# Altium footprint library PcbLib_ICs.PcbLib: 317 footprints (part 18 of 24)
Each footprint in its own frame and in the unit in brackets; x right, y up, seen from the top. Pads: shape width x height; smd on the part's side, far side on the other; paste and mask are expansions set on the pad; w line width, h text height; cw(c..) or ccw(c..) is an arc to the next point about the centre after c.
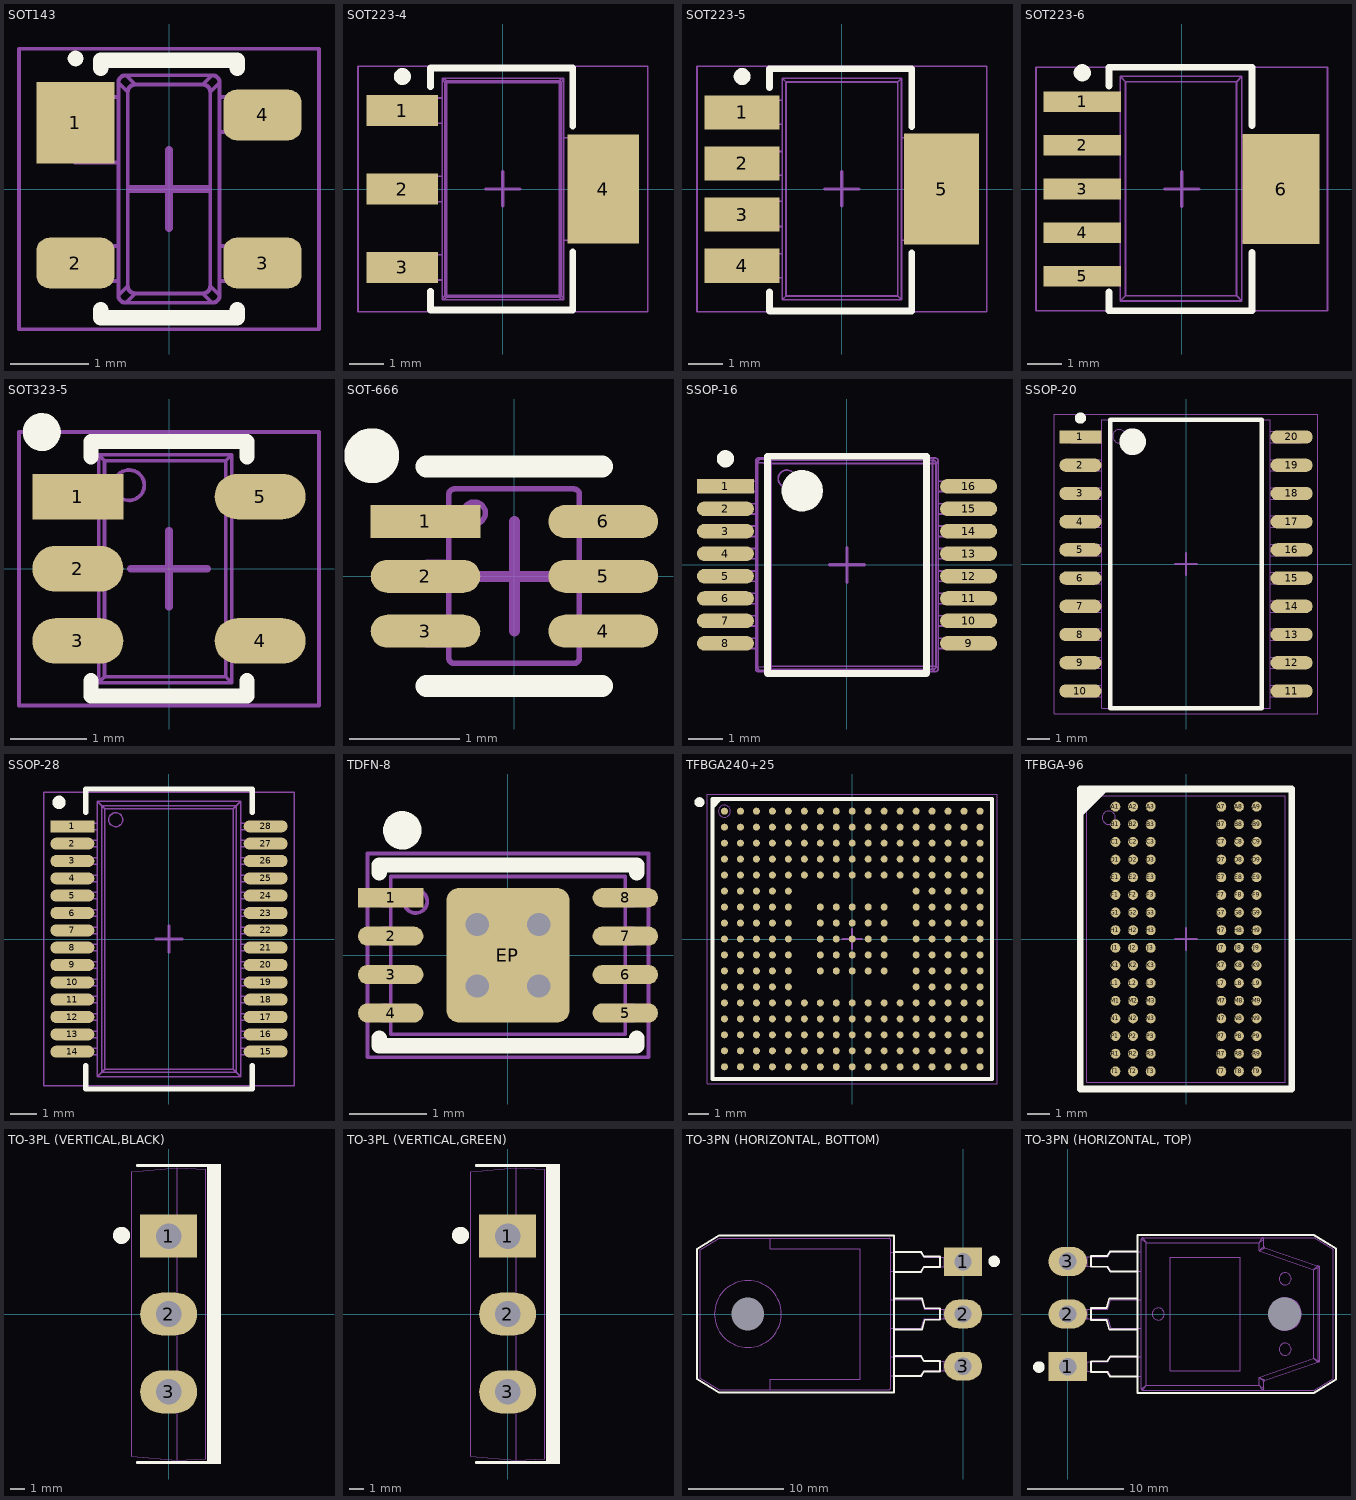
[diagram p17: the footprints below, top view; thin cyan lines are the x and y axes]

## SOT143 [mm] "SOT143, 4-Leads, Body 2.92x2.37mm, Pitch 1.90mm, IPC Medium Density"
height 1.2
pads (4):
  rect 1x1.05 smd paste+0 mask+0.05: 1(-1.2,0.85)
  rrect50% 1x0.65 smd paste+0 mask+0.05: 2(-1.2,-0.95) 3(1.2,-0.95) 4(1.2,0.95)
Top Overlay:
  circle w0.1: c-1.2,1.675 r0.05
  lines w0.2: -0.875,-1.55 -0.875,-1.65 0.875,-1.65 0.875,-1.55 ; -0.875,1.55 -0.875,1.65 0.875,1.65 0.875,1.55
Top Assy:
  drawing of 864 lines, arcs and shapes, not listed
  text ".Designator" at 0.233,-1.719 h1
Top Text:
  lines w0.05: -1.925,-1.8 1.925,-1.8 1.925,1.8 -1.925,1.8 -1.925,-1.8
  lines w0.1: -0.5,0 0.5,0 ; 0,-0.5 0,0.5
3D body "User Library-SOT143-1.step": height 1.22, standoff 0, extent -1.181,-1.45 1.182,1.45

## SOT223-4 [mm] "SOT223, 4-Leads, Body 6.50x7.00mm (avg), Pitch 2.30mm, IPC Medium Density"
height 1.8
pads (4):
  rect 2.1x0.9 smd paste+0 mask+0.05: 1(-2.95,2.3) 2(-2.95,0) 3(-2.95,-2.3)
  rect 2.1x3.2 smd paste-50 mask+0.05: 4(2.95,0)
Top Overlay:
  circle w0.25: c-2.95,3.3 r0.125
  lines w0.2: -2.125,-3 -2.125,-3.55 ; -2.125,3 -2.125,3.55 ; 2.05,-1.85 2.05,-3.55 -2.125,-3.55 ; 2.05,1.85 2.05,3.55 -2.125,3.55 ; -2.125,-3.55 -2.125,-3.55 ; -2.125,3.55 -2.125,3.55
Top Paste:
  region: 3.2,1.15 3.2,1.65 2.7,1.65 2.7,1.15
  region: 3.2,-0.25 3.2,0.25 2.7,0.25 2.7,-0.25
  region: 2.7,0.95 2.7,0.45 3.2,0.45 3.2,0.95
  region: 3.2,-0.95 3.2,-0.45 2.7,-0.45 2.7,-0.95
  region: 3.9,1.15 3.9,1.65 3.4,1.65 3.4,1.15
  region: 3.9,-0.25 3.9,0.25 3.4,0.25 3.4,-0.25
  region: 3.4,0.95 3.4,0.45 3.9,0.45 3.9,0.95
  region: 3.9,-0.95 3.9,-0.45 3.4,-0.45 3.4,-0.95
  region: 2.5,1.15 2.5,1.65 2,1.65 2,1.15
  region: 2.5,-0.25 2.5,0.25 2,0.25 2,-0.25
  region: 2,0.95 2,0.45 2.5,0.45 2.5,0.95
  region: 2.5,-0.95 2.5,-0.45 2,-0.45 2,-0.95
  region: 3.2,-1.65 3.2,-1.15 2.7,-1.15 2.7,-1.65
  region: 3.9,-1.65 3.9,-1.15 3.4,-1.15 3.4,-1.65
  region: 2.5,-1.65 2.5,-1.15 2,-1.15 2,-1.65
Top Assy:
  drawing of 521 lines, arcs and shapes, not listed
  text ".Designator" at 0.467,-3.443 h2
Top Text:
  lines w0.05: -4.25,-3.6 -4.25,3.6 4.25,3.6 4.25,-3.6 -4.25,-3.6
  lines w0.1: -0.5,0 0.5,0 ; 0,-0.5 0,0.5
3D body "SOT230P700X180-4N.step": height 1.8, standoff 0, extent -3.5,-3.35 3.5,3.35

## SOT223-5 [mm] "SOT223, 5-Leads, Body 6.50x7.00mm (avg), Pitch 1.50mm, IPC Medium Density"
height 1.8
pads (5):
  rect 2.2x1 smd paste+0 mask+0.05: 1(-2.925,2.25) 2(-2.925,0.75) 3(-2.925,-0.75) 4(-2.925,-2.25)
  rect 2.2x3.25 smd paste-50 mask+0.05: 5(2.925,0)
Top Overlay:
  circle w0.25: c-2.925,3.3 r0.125
  lines w0.2: -2.125,-3.025 -2.125,-3.575 2.05,-3.575 2.05,-1.875 ; -2.125,2.975 -2.125,3.525 2.05,3.525 2.05,1.825
Top Paste:
  region: 3.175,1.15 3.175,1.65 2.675,1.65 2.675,1.15
  region: 3.175,-0.25 3.175,0.25 2.675,0.25 2.675,-0.25
  region: 2.675,0.95 2.675,0.45 3.175,0.45 3.175,0.95
  region: 3.175,-0.95 3.175,-0.45 2.675,-0.45 2.675,-0.95
  region: 3.875,1.15 3.875,1.65 3.375,1.65 3.375,1.15
  region: 3.875,-0.25 3.875,0.25 3.375,0.25 3.375,-0.25
  region: 3.375,0.95 3.375,0.45 3.875,0.45 3.875,0.95
  region: 3.875,-0.95 3.875,-0.45 3.375,-0.45 3.375,-0.95
  region: 2.475,1.15 2.475,1.65 1.975,1.65 1.975,1.15
  region: 2.475,-0.25 2.475,0.25 1.975,0.25 1.975,-0.25
  region: 1.975,0.95 1.975,0.45 2.475,0.45 2.475,0.95
  region: 2.475,-0.95 2.475,-0.45 1.975,-0.45 1.975,-0.95
  region: 3.175,-1.65 3.175,-1.15 2.675,-1.15 2.675,-1.65
  region: 3.875,-1.65 3.875,-1.15 3.375,-1.15 3.375,-1.65
  region: 2.475,-1.65 2.475,-1.15 1.975,-1.15 1.975,-1.65
Top Assy:
  lines w0.05: -2.772,-2.6 -2.772,-1.9 ; -2.772,-2.6 -3.5,-2.6 -3.5,-1.9 -2.772,-1.9 ; -2.772,-2.6 -2.587,-2.6 ; -2.772,-1.9 -2.587,-1.9 ; -2.772,-1.1 -2.772,-0.361 ; -2.772,-1.1 -3.5,-1.1 -3.5,-0.361 -2.772,-0.361 ; -2.772,-1.1 -2.587,-1.1 ; -2.772,-0.361 -2.587,-0.361 ; -2.772,0.4 -2.772,1.1 ; -2.772,0.4 -3.5,0.4 -3.5,1.1 -2.772,1.1 ; -2.772,0.4 -2.587,0.4 ; -2.772,1.1 -2.587,1.1 ; -2.772,1.9 -2.772,2.6 ; -2.772,1.9 -3.5,1.9 -3.5,2.6 -2.772,2.6 ; -2.772,1.9 -2.587,1.9 ; -2.772,2.6 -2.587,2.6 ; -2.587,-2.6 -2.587,-1.9 ; -2.587,-2.6 -2.349,-2.6 ; -2.587,-1.9 -2.349,-1.9 ; -2.587,-1.1 -2.587,-0.361 ; -2.587,-1.1 -2.349,-1.1 ; -2.587,-0.361 -2.349,-0.361 ; -2.587,0.4 -2.587,1.1 ; -2.587,0.4 -2.349,0.4 ; -2.587,1.1 -2.349,1.1 ; -2.587,1.9 -2.587,2.6 ; -2.587,1.9 -2.349,1.9 ; -2.587,2.6 -2.349,2.6 ; -2.349,-2.6 -2.349,-1.9 ; -2.349,-2.6 -1.978,-2.6 ; -2.349,-1.9 -1.978,-1.9 ; -2.349,-1.1 -2.349,-0.361 ; -2.349,-1.1 -1.978,-1.1 ; -2.349,-0.361 -1.978,-0.361 ; -2.349,0.4 -2.349,1.1 ; -2.349,0.4 -1.978,0.4 ; -2.349,1.1 -1.978,1.1 ; -2.349,1.9 -2.349,2.6 ; -2.349,1.9 -1.978,1.9 ; -2.349,2.6 -1.978,2.6 ; -1.978,-2.6 -1.978,-1.9 ; -1.978,-2.6 -1.75,-2.6 ; -1.978,-1.9 -1.75,-1.9 ; -1.978,-1.1 -1.978,-0.361 ; -1.978,-1.1 -1.75,-1.1 ; -1.978,-0.361 -1.75,-0.361 ; -1.978,0.4 -1.978,1.1 ; -1.978,0.4 -1.75,0.4 ; -1.978,1.1 -1.75,1.1 ; -1.978,1.9 -1.978,2.6 ; -1.978,1.9 -1.75,1.9 ; -1.978,2.6 -1.75,2.6 ; -1.75,-3.25 1.75,-3.25 ; -1.75,-3.25 -1.641,-3.141 ; -1.75,-3.25 -1.75,-2.6 ; -1.75,-2.6 -1.75,-1.9 ; -1.75,-1.9 -1.75,-1.1 ; -1.75,-1.1 -1.75,-0.361 ; -1.75,-0.361 -1.75,0.4 ; -1.75,0.4 -1.75,1.1 ; -1.75,1.1 -1.75,1.9 ; -1.75,1.9 -1.75,2.6 ; -1.75,2.6 -1.75,3.25 ; -1.75,3.25 1.75,3.25 ; -1.75,3.25 -1.641,3.141 ; -1.641,-3.141 1.641,-3.141 ; -1.641,-3.141 -1.641,3.141 ; -1.641,3.141 1.641,3.141 ; 1.641,-3.141 1.641,3.141 ; 1.641,-3.141 1.75,-3.25 ; 1.641,3.141 1.75,3.25 ; 1.75,-3.25 1.75,-1.5 ; 1.75,-1.5 1.978,-1.5 ; 1.75,-1.5 1.75,1.5 ; 1.75,1.5 1.978,1.5 ; 1.75,1.5 1.75,3.25 ; 1.978,-1.5 1.978,1.5 ; 1.978,-1.5 2.349,-1.5 ; 1.978,1.5 2.349,1.5 ; 2.349,-1.5 2.349,1.5 ; 2.349,-1.5 2.587,-1.5 ; 2.349,1.5 2.587,1.5 ; 2.587,-1.5 2.587,1.5 ; 2.587,-1.5 2.772,-1.5 ; 2.587,1.5 2.772,1.5 ; 2.772,-1.5 2.772,1.5 ; 2.772,-1.5 3.5,-1.5 3.5,1.5 2.772,1.5
  text ".Designator" at 0.467,-3.443 h2
Top Text:
  lines w0.05: -4.25,-3.6 4.25,-3.6 4.25,3.6 -4.25,3.6 -4.25,-3.6
  lines w0.1: -0.5,0 0.5,0 ; 0,-0.5 0,0.5
3D body "SOT150P700X180-5N.step": height 1.8, standoff 0, extent -3.5,-3.35 3.5,3.35

## SOT223-6 [mm] "SOT223, 6-Leads, Body 6.50x7.00mm (avg), Pitch 1.27mm, IPC Medium Density"
height 1.8
pads (6):
  rect 2.25x0.6 smd paste+0 mask+0.05: 1(-2.9,2.54) 2(-2.9,1.27) 3(-2.9,0) 4(-2.9,-1.27) 5(-2.9,-2.54)
  rect 2.25x3.2 smd paste-50 mask+0.05: 6(2.9,0)
Top Overlay:
  circle w0.25: c-2.9,3.39 r0.125
  lines w0.2: -2.125,-3 -2.125,-3.55 2.05,-3.55 2.05,-1.85 ; -2.125,3 -2.125,3.55 2.05,3.55 2.05,1.85
Top Paste:
  region: 2.45,-1.65 2.45,-1.15 1.95,-1.15 1.95,-1.65
  region: 3.85,-1.65 3.85,-1.15 3.35,-1.15 3.35,-1.65
  region: 3.15,-1.65 3.15,-1.15 2.65,-1.15 2.65,-1.65
  region: 2.45,-0.95 2.45,-0.45 1.95,-0.45 1.95,-0.95
  region: 1.95,0.95 1.95,0.45 2.45,0.45 2.45,0.95
  region: 2.45,-0.25 2.45,0.25 1.95,0.25 1.95,-0.25
  region: 2.45,1.15 2.45,1.65 1.95,1.65 1.95,1.15
  region: 3.85,-0.95 3.85,-0.45 3.35,-0.45 3.35,-0.95
  region: 3.35,0.95 3.35,0.45 3.85,0.45 3.85,0.95
  region: 3.85,-0.25 3.85,0.25 3.35,0.25 3.35,-0.25
  region: 3.85,1.15 3.85,1.65 3.35,1.65 3.35,1.15
  region: 3.15,-0.95 3.15,-0.45 2.65,-0.45 2.65,-0.95
  region: 2.65,0.95 2.65,0.45 3.15,0.45 3.15,0.95
  region: 3.15,-0.25 3.15,0.25 2.65,0.25 2.65,-0.25
  region: 3.15,1.15 3.15,1.65 2.65,1.65 2.65,1.15
Top Assy:
  lines w0.05: -3.078,-2.78 -3.078,-2.28 ; -3.078,-2.78 -3.65,-2.78 -3.65,-2.28 -3.078,-2.28 ; -3.078,-2.78 -2.794,-2.78 ; -3.078,-2.28 -2.794,-2.28 ; -3.078,-1.51 -3.078,-1.01 ; -3.078,-1.51 -3.65,-1.51 -3.65,-1.01 -3.078,-1.01 ; -3.078,-1.51 -2.794,-1.51 ; -3.078,-1.01 -2.794,-1.01 ; -3.078,-0.24 -3.65,-0.24 -3.65,0.26 -3.078,0.26 ; -3.078,-0.24 -2.794,-0.24 ; -3.078,-0.24 -3.078,0.26 ; -3.078,0.26 -2.794,0.26 ; -3.078,1.03 -3.078,1.53 ; -3.078,1.03 -3.65,1.03 -3.65,1.53 -3.078,1.53 ; -3.078,1.03 -2.794,1.03 ; -3.078,1.53 -2.794,1.53 ; -3.078,2.3 -3.078,2.8 ; -3.078,2.3 -3.65,2.3 -3.65,2.8 -3.078,2.8 ; -3.078,2.3 -2.794,2.3 ; -3.078,2.8 -2.794,2.8 ; -2.794,-2.78 -2.794,-2.28 ; -2.794,-2.78 -2.719,-2.78 ; -2.794,-2.28 -2.719,-2.28 ; -2.794,-1.51 -2.794,-1.01 ; -2.794,-1.51 -2.719,-1.51 ; -2.794,-1.01 -2.719,-1.01 ; -2.794,-0.24 -2.719,-0.24 ; -2.794,-0.24 -2.794,0.26 ; -2.794,0.26 -2.719,0.26 ; -2.794,1.03 -2.794,1.53 ; -2.794,1.03 -2.719,1.03 ; -2.794,1.53 -2.719,1.53 ; -2.794,2.3 -2.794,2.8 ; -2.794,2.3 -2.719,2.3 ; -2.794,2.8 -2.719,2.8 ; -2.719,-2.78 -2.719,-2.28 ; -2.719,-2.78 -2.224,-2.78 ; -2.719,-2.28 -2.224,-2.28 ; -2.719,-1.51 -2.719,-1.01 ; -2.719,-1.51 -2.224,-1.51 ; -2.719,-1.01 -2.224,-1.01 ; -2.719,-0.24 -2.224,-0.24 ; -2.719,-0.24 -2.719,0.26 ; -2.719,0.26 -2.224,0.26 ; -2.719,1.03 -2.719,1.53 ; -2.719,1.03 -2.224,1.03 ; -2.719,1.53 -2.224,1.53 ; -2.719,2.3 -2.719,2.8 ; -2.719,2.3 -2.224,2.3 ; -2.719,2.8 -2.224,2.8 ; -2.224,-2.78 -2.224,-2.28 ; -2.224,-2.78 -1.795,-2.78 ; -2.224,-2.28 -1.795,-2.28 ; -2.224,-1.51 -2.224,-1.01 ; -2.224,-1.51 -1.795,-1.51 ; -2.224,-1.01 -1.795,-1.01 ; -2.224,-0.24 -2.224,0.26 ; -2.224,-0.24 -1.795,-0.24 ; -2.224,0.26 -1.795,0.26 ; -2.224,1.03 -2.224,1.53 ; -2.224,1.03 -1.795,1.03 ; -2.224,1.53 -1.795,1.53 ; -2.224,2.3 -2.224,2.8 ; -2.224,2.3 -1.795,2.3 ; -2.224,2.8 -1.795,2.8 ; -1.795,-3.265 -1.795,-2.78 ; -1.795,-3.265 -1.64,-3.11 ; -1.795,-3.265 1.755,-3.265 ; -1.795,-2.78 -1.795,-2.28 ; -1.795,-2.28 -1.795,-1.51 ; -1.795,-1.51 -1.795,-1.01 ; -1.795,-1.01 -1.795,-0.24 ; -1.795,-0.24 -1.795,0.26 ; -1.795,0.26 -1.795,1.03 ; -1.795,1.03 -1.795,1.53 ; -1.795,1.53 -1.795,2.3 ; -1.795,2.3 -1.795,2.8 ; -1.795,2.8 -1.795,3.285 ; -1.795,3.285 -1.64,3.13 ; -1.795,3.285 1.755,3.285 ; -1.64,-3.11 -1.64,3.13 ; -1.64,-3.11 1.6,-3.11 ; -1.64,3.13 1.6,3.13 ; 1.6,-3.11 1.755,-3.265 ; 1.6,-3.11 1.6,3.13 ; 1.6,3.13 1.755,3.285 ; 1.755,-3.265 1.755,-1.515 ; 1.755,-1.515 1.755,1.535 ; 1.755,-1.515 2.184,-1.515 ; 1.755,1.535 1.755,3.285 ; 1.755,1.535 2.184,1.535 ; 2.184,-1.515 2.679,-1.515 ; 2.184,-1.515 2.184,1.535 ; 2.184,1.535 2.679,1.535 ; 2.679,-1.515 2.754,-1.515 ; 2.679,-1.515 2.679,1.535 ; 2.679,1.535 2.754,1.535 ; 2.754,-1.515 3.038,-1.515 ; 2.754,-1.515 2.754,1.535 ; 2.754,1.535 3.038,1.535 ; 3.038,-1.515 3.61,-1.515 3.61,1.535 3.038,1.535 ; 3.038,-1.515 3.038,1.535
  text ".Designator" at 0.467,-3.443 h2
Top Text:
  lines w0.05: -4.25,-3.55 4.25,-3.55 4.25,3.55 -4.25,3.55 -4.25,-3.55
  lines w0.1: -0.5,0 0.5,0 ; 0,-0.5 0,0.5
3D body "SOT-223-6.STEP": height 1.8, standoff 0, extent -3.63,-3.275 3.63,3.275

## SOT323-5 [mm] "SOT23, 5-Leads, Body 2.90x2.80mm, Pitch 0.95mm, IPC Medium Density"
height 1.1
pads (5):
  rect 1.2x0.6 smd paste+0 mask+0.05: 1(-1.2,0.95)
  oval 1.2x0.6 smd paste+0 mask+0.05: 2(-1.2,0) 3(-1.2,-0.95) 4(1.2,-0.95) 5(1.2,0.95)
Top Overlay:
  circle w0.25: c-1.675,1.8 r0.125
  lines w0.2: -1.025,-1.475 -1.025,-1.675 1.025,-1.675 1.025,-1.475 ; -1.025,1.475 -1.025,1.675 1.025,1.675 1.025,1.475
Top Assy:
  circle w0.05: c-0.525,1.1 r0.2
  lines w0.05: -1.35,-1.15 -1.35,-0.75 ; -1.35,-1.15 -1.55,-1.15 -1.55,-0.75 -1.35,-0.75 ; -1.35,-1.15 -1.311,-1.15 ; -1.35,-0.75 -1.311,-0.75 ; -1.35,-0.2 -1.35,0.2 ; -1.35,-0.2 -1.55,-0.2 -1.55,0.2 -1.35,0.2 ; -1.35,-0.2 -1.311,-0.2 ; -1.35,0.2 -1.311,0.2 ; -1.35,0.75 -1.35,1.15 ; -1.35,0.75 -1.55,0.75 -1.55,1.15 -1.35,1.15 ; -1.35,0.75 -1.311,0.75 ; -1.35,1.15 -1.311,1.15 ; -1.311,-1.15 -1.311,-0.75 ; -1.311,-1.15 -1.183,-1.15 ; -1.311,-0.75 -1.183,-0.75 ; -1.311,-0.2 -1.311,0.2 ; -1.311,-0.2 -1.183,-0.2 ; -1.311,0.2 -1.183,0.2 ; -1.311,0.75 -1.311,1.15 ; -1.311,0.75 -1.183,0.75 ; -1.311,1.15 -1.183,1.15 ; -1.183,-1.15 -1.183,-0.75 ; -1.183,-1.15 -1.025,-1.15 ; -1.183,-0.75 -1.025,-0.75 ; -1.183,-0.2 -1.183,0.2 ; -1.183,-0.2 -1.025,-0.2 ; -1.183,0.2 -1.025,0.2 ; -1.183,0.75 -1.183,1.15 ; -1.183,0.75 -1.025,0.75 ; -1.183,1.15 -1.025,1.15 ; -1.025,-1.15 -1.025,-0.75 ; -1.025,-1.15 -0.925,-1.15 -0.925,-0.75 -1.025,-0.75 ; -1.025,-0.2 -1.025,0.2 ; -1.025,-0.2 -0.925,-0.2 -0.925,0.2 -1.025,0.2 ; -1.025,0.75 -1.025,1.15 ; -1.025,0.75 -0.925,0.75 -0.925,1.15 -1.025,1.15 ; -0.925,-1.5 0.825,-1.5 ; -0.925,-1.5 -0.925,1.5 ; -0.925,-1.5 -0.847,-1.422 ; -0.925,1.5 0.825,1.5 ; -0.925,1.5 -0.847,1.422 ; -0.847,-1.422 0.747,-1.422 ; -0.847,-1.422 -0.847,1.422 ; -0.847,1.422 0.747,1.422 ; 0.747,-1.422 0.747,1.422 ; 0.747,-1.422 0.825,-1.5 ; 0.747,1.422 0.825,1.5 ; 0.825,-1.5 0.825,1.5 ; 0.925,-1.15 0.925,-0.75 ; 0.925,-1.15 1.083,-1.15 ; 0.925,-1.15 0.825,-1.15 0.825,-0.75 0.925,-0.75 ; 0.925,-0.75 1.083,-0.75 ; 0.925,0.75 0.925,1.15 ; 0.925,0.75 1.083,0.75 ; 0.925,0.75 0.825,0.75 0.825,1.15 0.925,1.15 ; 0.925,1.15 1.083,1.15 ; 1.083,-1.15 1.083,-0.75 ; 1.083,-1.15 1.211,-1.15 ; 1.083,-0.75 1.211,-0.75 ; 1.083,0.75 1.083,1.15 ; 1.083,0.75 1.211,0.75 ; 1.083,1.15 1.211,1.15 ; 1.211,-1.15 1.211,-0.75 ; 1.211,-1.15 1.25,-1.15 ; 1.211,-0.75 1.25,-0.75 ; 1.211,0.75 1.211,1.15 ; 1.211,0.75 1.25,0.75 ; 1.211,1.15 1.25,1.15 ; 1.25,-1.15 1.25,-0.75 ; 1.25,-1.15 1.45,-1.15 1.45,-0.75 1.25,-0.75 ; 1.25,0.75 1.25,1.15 ; 1.25,0.75 1.45,0.75 1.45,1.15 1.25,1.15
  text ".Designator" at 0.233,-1.719 h1
Top Text:
  lines w0.05: -1.975,-1.8 -1.975,1.8 1.975,1.8 1.975,-1.8 -1.975,-1.8
  lines w0.1: -0.5,0 0.5,0 ; 0,-0.5 0,0.5
3D body "User Library-SOT-23-5.STEP": height 1.47, standoff 0.01, extent -1.55,-1.5 1.45,1.5

## SOT-666 [mm]
pads (6):
  rect 1x0.3 smd paste+0 mask+0.05: 1(-0.81,0.5)
  oval 1x0.3 smd paste+0 mask+0.05: 2(-0.81,0) 3(-0.81,-0.5) 4(0.81,-0.5) 5(0.81,0) 6(0.81,0.5)
Top Overlay:
  circle w0.25: c-1.3,1.1 r0.125
  lines w0.2: -0.8,-1 0.8,-1 ; -0.8,1 0.8,1
Top Assy:
  circle w0.05: c-0.365,0.578 r0.1
  lines w0.05: -0.802,-0.119 -0.802,0.121 ; -0.797,-0.624 -0.595,-0.624 ; -0.797,-0.619 -0.797,-0.379 -0.595,-0.379 ; -0.797,-0.119 -0.595,-0.119 ; -0.797,0.126 -0.595,0.126 ; -0.595,0.381 -0.797,0.381 -0.797,0.621 -0.595,0.621 ; 0.591,-0.619 0.793,-0.619 0.793,-0.379 0.591,-0.379 ; 0.591,-0.119 0.793,-0.119 0.793,0.121 0.591,0.121 ; 0.591,0.381 0.793,0.381 0.793,0.621 0.591,0.621 ; -0.597,-0.744 ccw(c-0.547,-0.744) -0.547,-0.794 0.544,-0.794 ccw(c0.544,-0.744) 0.594,-0.744 0.594,0.747 ccw(c0.544,0.747) 0.544,0.797 -0.547,0.797 ccw(c-0.547,0.747) -0.597,0.747 -0.597,-0.744
  text ".Designator" at 0.186,-1.374 h0.8
Top Text:
  lines w0.1: -0.5,0 0.5,0 ; 0,-0.5 0,0.5
3D body "User Library-SOT50P160X60-6.step": height 0.6, standoff 0, extent -0.8,-0.795 0.8,0.795

## SSOP-16 [mm] "SSOP, 16-Leads, Body 6,20x5,29mm, Pitch 0,65mm, IPC Medium Density"
height 1.99
pads (16):
  rect 1.65x0.42 smd mask+0.05: 1(-3.525,2.275)
  oval 1.65x0.42 smd mask+0.05: 2(-3.525,1.625) 3(-3.525,0.975) 4(-3.525,0.325) 5(-3.525,-0.325) 6(-3.525,-0.975) 7(-3.525,-1.625) 8(-3.525,-2.275) 9(3.525,-2.275) 10(3.525,-1.625) 11(3.525,-0.975) 12(3.525,-0.325) 13(3.525,0.325) 14(3.525,0.975) 15(3.525,1.625) 16(3.525,2.275)
Top Overlay:
  circle w0.6: c-1.3,2.15 r0.3
  circle w0.25: c-3.525,3.075 r0.125
  lines w0.2: -2.3,-3.15 2.3,-3.15 2.3,3.15 -2.3,3.15 -2.3,-3.15
Top Assy:
  drawing of 327 lines, arcs and shapes, not listed
  text ".Designator" at 0.467,-3.443 h2
Top Text:
  lines w0.1: -0.5,0 0.5,0 ; 0,-0.5 0,0.5
3D body "SSOP-16(16L).STEP": height 1.98, standoff 0, extent -3.888,-3.1 3.888,3.1

## SSOP-20 [mm] "SSOP, 20-Leads, Body 12.80x7.50mm, Pitch 1.27mm, IPC Medium Density"
height 2.65
pads (20):
  rect 1.9x0.6 smd paste+0 mask+0.05: 1(-4.75,5.715)
  oval 1.9x0.6 smd paste+0 mask+0.05: 2(-4.75,4.445) 3(-4.75,3.175) 4(-4.75,1.905) 5(-4.75,0.635) 6(-4.75,-0.635) 7(-4.75,-1.905) 8(-4.75,-3.175) 9(-4.75,-4.445) 10(-4.75,-5.715) 11(4.75,-5.715) 12(4.75,-4.445) 13(4.75,-3.175) 14(4.75,-1.905) 15(4.75,-0.635) 16(4.75,0.635) 17(4.75,1.905) 18(4.75,3.175) 19(4.75,4.445) 20(4.75,5.715)
Top Overlay:
  circle w0.25: c-4.75,6.565 r0.125
  circle w0.6: c-2.4,5.5 r0.3
  lines w0.2: -3.4,-6.5 -3.4,6.5 3.4,6.5 3.4,-6.5 -3.4,-6.5
Top Assy:
  drawing of 325 lines, arcs and shapes, not listed
  text ".Designator" at 0.467,-3.443 h2
Top Text:
  lines w0.05: -5.925,-6.75 -5.925,6.75 5.925,6.75 5.925,-6.75 -5.925,-6.75
  lines w0.1: -0.5,0 0.5,0 ; 0,-0.5 0,0.5
3D body "SSOP-20.step": height 2.65, standoff 0, extent -5.162,-6.5 5.163,6.5

## SSOP-28 [mm] "SSOP, 28-Leads, Body 10,20x5,30mm, Pitch 0,65mm, IPC Medium Density"
height 2
pads (28):
  rect 1.65x0.45 smd paste+0 mask+0.05: 1(-3.625,4.225)
  oval 1.65x0.45 smd paste+0 mask+0.05: 2(-3.625,3.575) 3(-3.625,2.925) 4(-3.625,2.275) 5(-3.625,1.625) 6(-3.625,0.975) 7(-3.625,0.325) 8(-3.625,-0.325) 9(-3.625,-0.975) 10(-3.625,-1.625) 11(-3.625,-2.275) 12(-3.625,-2.925) 13(-3.625,-3.575) 14(-3.625,-4.225) 15(3.625,-4.225) 16(3.625,-3.575) 17(3.625,-2.925) 18(3.625,-2.275) 19(3.625,-1.625) 20(3.625,-0.975) 21(3.625,-0.325) 22(3.625,0.325) 23(3.625,0.975) 24(3.625,1.625) 25(3.625,2.275) 26(3.625,2.925) 27(3.625,3.575) 28(3.625,4.225)
Top Overlay:
  circle w0.25: c-4.125,5.125 r0.125
  lines w0.2: -3.125,-4.75 -3.125,-5.625 3.125,-5.625 3.125,-4.75 ; -3.125,4.75 -3.125,5.625 3.125,5.625 3.125,4.75
Top Assy:
  drawing of 497 lines, arcs and shapes, not listed
  text ".Designator" at 0.467,-3.443 h2
Top Text:
  lines w0.05: -4.7,-5.5 4.7,-5.5 4.7,5.5 -4.7,5.5 -4.7,-5.5
  lines w0.1: -0.5,0 0.5,0 ; 0,-0.5 0,0.5
3D body "User Library-SSOP-28-3.STEP": height 1.9, standoff 0, extent -3.875,-5.075 3.925,5.125

## TDFN-8 [mm] "TDFN-8 package with 0.5mm pitch"
height 0.75
pads (9):
  rect 0.85x0.25 smd paste+0 mask+0.08: 1(-1.525,0.75)
  oval 0.85x0.25 smd paste+0 mask+0.08: 2(-1.525,0.25) 3(-1.525,-0.25) 4(-1.525,-0.75) 5(1.525,-0.75) 6(1.525,-0.25) 7(1.525,0.25) 8(1.525,0.75)
  rrect20% 1.6x1.75 smd paste-50 mask+0.08: EP(0,0)
via 0.4,0.4 diameter 0.7 hole 0.3
via -0.4,0.4 diameter 0.7 hole 0.3
via 0.4,-0.4 diameter 0.7 hole 0.3
via -0.4,-0.4 diameter 0.7 hole 0.3
Top Overlay:
  circle w0.25: c-1.375,1.625 r0.125
  lines w0.2: -1.675,-1.075 -1.675,-1.175 -1.475,-1.175 1.475,-1.175 1.675,-1.175 1.675,-1.075 ; -1.675,1.075 -1.675,1.175 -1.475,1.175 1.475,1.175 1.675,1.175 1.675,1.075
Top Paste:
  region: 0.7,-0.7 0.7,-0.1 0.1,-0.1 0.1,-0.7
  region: 0.7,0.1 0.7,0.7 0.1,0.7 0.1,0.1
  region: -0.1,-0.7 -0.1,-0.1 -0.7,-0.1 -0.7,-0.7
  region: -0.1,0.1 -0.1,0.7 -0.7,0.7 -0.7,0.1
Bottom Solder:
  region: -1,1 -0.3,1 0,0.7 0.3,1 1,1 1,0.3 0.7,0 1,-0.3 1,-1 0.3,-1 0,-0.7 -0.3,-1 -1,-1 -1,-0.3 -0.7,0 -1,0.3
Top Assy:
  circle w0.05: c-1.2,0.7 r0.15
  lines w0.05: -1.525,-0.85 -1.63,-0.85 -1.63,-0.65 -1.525,-0.65 ; -1.525,-0.35 -1.63,-0.35 -1.63,-0.15 -1.525,-0.15 ; -1.525,0.15 -1.63,0.15 -1.63,0.35 -1.525,0.35 ; -1.525,0.65 -1.63,0.65 -1.63,0.85 -1.525,0.85 ; 1.525,-0.85 1.63,-0.85 1.63,-0.65 1.525,-0.65 ; 1.525,-0.35 1.63,-0.35 1.63,-0.15 1.525,-0.15 ; 1.525,0.15 1.63,0.15 1.63,0.35 1.525,0.35 ; 1.525,0.65 1.63,0.65 1.63,0.85 1.525,0.85 ; -1.525,-1.025 1.525,-1.025 1.525,1.025 -1.525,1.025 -1.525,-1.025
  text ".Designator" at -1.719,-0.233 h1
Top Text:
  lines w0.05: -1.825,-1.325 1.825,-1.325 1.825,1.325 -1.825,1.325 -1.825,-1.325
  lines w0.1: -0.5,0 0.5,0 ; 0,-0.5 0,0.5
3D body "TDFN-8.step": height 0.75, standoff 0, extent -1.575,-1.025 1.575,1.025

## TFBGA240+25 [mm] "BGA, 265-Leads, Body 14,00x14,00mmx1,10mm, Pitch 0,80mm"
height 1.1
pads (265):
  round 0.35 smd paste+0 mask+0.05: A1(-6.4,6.4) A2(-5.6,6.4) A3(-4.8,6.4) A4(-4,6.4) A5(-3.2,6.4) A6(-2.4,6.4) A7(-1.6,6.4) A8(-0.8,6.4) A9(0,6.4) A10(0.8,6.4) A11(1.6,6.4) A12(2.4,6.4) A13(3.2,6.4) A14(4,6.4) A15(4.8,6.4) A16(5.6,6.4) A17(6.4,6.4) B1(-6.4,5.6) B2(-5.6,5.6) B3(-4.8,5.6) B4(-4,5.6) B5(-3.2,5.6) B6(-2.4,5.6) B7(-1.6,5.6) B8(-0.8,5.6) B9(0,5.6) B10(0.8,5.6) B11(1.6,5.6) B12(2.4,5.6) B13(3.2,5.6) B14(4,5.6) B15(4.8,5.6) B16(5.6,5.6) B17(6.4,5.6) C1(-6.4,4.8) C2(-5.6,4.8) C3(-4.8,4.8) C4(-4,4.8) C5(-3.2,4.8) C6(-2.4,4.8) C7(-1.6,4.8) C8(-0.8,4.8) C9(0,4.8) C10(0.8,4.8) C11(1.6,4.8) C12(2.4,4.8) C13(3.2,4.8) C14(4,4.8) C15(4.8,4.8) C16(5.6,4.8) C17(6.4,4.8) D1(-6.4,4) D2(-5.6,4) D3(-4.8,4) D4(-4,4) D5(-3.2,4) D6(-2.4,4) D7(-1.6,4) D8(-0.8,4) D9(0,4) D10(0.8,4) D11(1.6,4) D12(2.4,4) D13(3.2,4) D14(4,4) D15(4.8,4) D16(5.6,4) D17(6.4,4) E1(-6.4,3.2) E2(-5.6,3.2) E3(-4.8,3.2) E4(-4,3.2) E5(-3.2,3.2) E6(-2.4,3.2) E7(-1.6,3.2) E8(-0.8,3.2) E9(0,3.2) E10(0.8,3.2) E11(1.6,3.2) E12(2.4,3.2) E13(3.2,3.2) E14(4,3.2) E15(4.8,3.2) E16(5.6,3.2) E17(6.4,3.2) F1(-6.4,2.4) F2(-5.6,2.4) F3(-4.8,2.4) F4(-4,2.4) F5(-3.2,2.4) F13(3.2,2.4) F14(4,2.4) F15(4.8,2.4) F16(5.6,2.4) F17(6.4,2.4) G1(-6.4,1.6) G2(-5.6,1.6) G3(-4.8,1.6) G4(-4,1.6) G5(-3.2,1.6) G7(-1.6,1.6) G8(-0.8,1.6) G9(0,1.6) G10(0.8,1.6) G11(1.6,1.6) G13(3.2,1.6) G14(4,1.6) G15(4.8,1.6) G16(5.6,1.6) G17(6.4,1.6) H1(-6.4,0.8) H2(-5.6,0.8) H3(-4.8,0.8) H4(-4,0.8) H5(-3.2,0.8) H7(-1.6,0.8) H8(-0.8,0.8) H9(0,0.8) H10(0.8,0.8) H11(1.6,0.8) H13(3.2,0.8) H14(4,0.8) H15(4.8,0.8) H16(5.6,0.8) H17(6.4,0.8) J1(-6.4,0) J2(-5.6,0) J3(-4.8,0) J4(-4,0) J5(-3.2,0) J7(-1.6,0) J8(-0.8,0) J9(0,0) J10(0.8,0) J11(1.6,0) J13(3.2,0) J14(4,0) J15(4.8,0) J16(5.6,0) J17(6.4,0) K1(-6.4,-0.8) K2(-5.6,-0.8) K3(-4.8,-0.8) K4(-4,-0.8) K5(-3.2,-0.8) K7(-1.6,-0.8) K8(-0.8,-0.8) K9(0,-0.8) K10(0.8,-0.8) K11(1.6,-0.8) K13(3.2,-0.8) K14(4,-0.8) K15(4.8,-0.8) K16(5.6,-0.8) K17(6.4,-0.8) L1(-6.4,-1.6) L2(-5.6,-1.6) L3(-4.8,-1.6) L4(-4,-1.6) L5(-3.2,-1.6) L7(-1.6,-1.6) L8(-0.8,-1.6) L9(0,-1.6) L10(0.8,-1.6) L11(1.6,-1.6) L13(3.2,-1.6) L14(4,-1.6) L15(4.8,-1.6) L16(5.6,-1.6) L17(6.4,-1.6) M1(-6.4,-2.4) M2(-5.6,-2.4) M3(-4.8,-2.4) M4(-4,-2.4) M5(-3.2,-2.4) M13(3.2,-2.4) M14(4,-2.4) M15(4.8,-2.4) M16(5.6,-2.4) M17(6.4,-2.4) N1(-6.4,-3.2) N2(-5.6,-3.2) N3(-4.8,-3.2) N4(-4,-3.2) N5(-3.2,-3.2) N6(-2.4,-3.2) N7(-1.6,-3.2) N8(-0.8,-3.2) N9(0,-3.2) N10(0.8,-3.2) N11(1.6,-3.2) N12(2.4,-3.2) N13(3.2,-3.2) N14(4,-3.2) N15(4.8,-3.2) N16(5.6,-3.2) N17(6.4,-3.2) P1(-6.4,-4) P2(-5.6,-4) P3(-4.8,-4) P4(-4,-4) P5(-3.2,-4) P6(-2.4,-4) P7(-1.6,-4) P8(-0.8,-4) P9(0,-4) P10(0.8,-4) P11(1.6,-4) P12(2.4,-4) P13(3.2,-4) P14(4,-4) P15(4.8,-4) P16(5.6,-4) P17(6.4,-4) R1(-6.4,-4.8) R2(-5.6,-4.8) R3(-4.8,-4.8) R4(-4,-4.8) R5(-3.2,-4.8) R6(-2.4,-4.8) R7(-1.6,-4.8) R8(-0.8,-4.8) R9(0,-4.8) R10(0.8,-4.8) R11(1.6,-4.8) R12(2.4,-4.8) R13(3.2,-4.8) R14(4,-4.8) R15(4.8,-4.8) R16(5.6,-4.8) R17(6.4,-4.8) T1(-6.4,-5.6) T2(-5.6,-5.6) T3(-4.8,-5.6) T4(-4,-5.6) T5(-3.2,-5.6) T6(-2.4,-5.6) T7(-1.6,-5.6) T8(-0.8,-5.6) T9(0,-5.6) T10(0.8,-5.6) T11(1.6,-5.6) T12(2.4,-5.6) T13(3.2,-5.6) T14(4,-5.6) T15(4.8,-5.6) T16(5.6,-5.6) T17(6.4,-5.6) U1(-6.4,-6.4) U2(-5.6,-6.4) U3(-4.8,-6.4) U4(-4,-6.4) U5(-3.2,-6.4) U6(-2.4,-6.4) U7(-1.6,-6.4) U8(-0.8,-6.4) U9(0,-6.4) U10(0.8,-6.4) U11(1.6,-6.4) U12(2.4,-6.4) U13(3.2,-6.4) U14(4,-6.4) U15(4.8,-6.4) U16(5.6,-6.4) U17(6.4,-6.4)
Top Overlay:
  circle w0.25: c-7.65,6.85 r0.125
  region: -6.613,7 -7,6.613 -7,7
  lines w0.2: -7,6.613 -6.613,7 ; -7,-7 -7,7 7,7 7,-7 -7,-7
Top Assy:
  circle w0.05: c-6.4,6.4 r0.3
  lines w0.05: -7,-7 -7,7 7,7 7,-7 -7,-7
  text ".Designator" at -3.443,-0.467 h2
Top Text:
  lines w0.05: -7.25,-7.25 -7.25,7.25 7.25,7.25 7.25,-7.25 -7.25,-7.25
  lines w0.1: -0.5,0 0.5,0 ; 0,-0.5 0,0.5
3D body "TFBGA-240+25.STEP": height 1.17, standoff 0, extent -7,-7 7,7

## TFBGA-96 [mm] "TFBGA-96 package with 0.8mm pitch, 9x13mm"
height 1.2
pads (96):
  round 0.45 smd paste+0 mask+0.05: A1(-3.2,6) A2(-2.4,6) A3(-1.6,6) A7(1.6,6) A8(2.4,6) A9(3.2,6) B1(-3.2,5.2) B2(-2.4,5.2) B3(-1.6,5.2) B7(1.6,5.2) B8(2.4,5.2) B9(3.2,5.2) C1(-3.2,4.4) C2(-2.4,4.4) C3(-1.6,4.4) C7(1.6,4.4) C8(2.4,4.4) C9(3.2,4.4) D1(-3.2,3.6) D2(-2.4,3.6) D3(-1.6,3.6) D7(1.6,3.6) D8(2.4,3.6) D9(3.2,3.6) E1(-3.2,2.8) E2(-2.4,2.8) E3(-1.6,2.8) E7(1.6,2.8) E8(2.4,2.8) E9(3.2,2.8) F1(-3.2,2) F2(-2.4,2) F3(-1.6,2) F7(1.6,2) F8(2.4,2) F9(3.2,2) G1(-3.2,1.2) G2(-2.4,1.2) G3(-1.6,1.2) G7(1.6,1.2) G8(2.4,1.2) G9(3.2,1.2) H1(-3.2,0.4) H2(-2.4,0.4) H3(-1.6,0.4) H7(1.6,0.4) H8(2.4,0.4) H9(3.2,0.4) J1(-3.2,-0.4) J2(-2.4,-0.4) J3(-1.6,-0.4) J7(1.6,-0.4) J8(2.4,-0.4) J9(3.2,-0.4) K1(-3.2,-1.2) K2(-2.4,-1.2) K3(-1.6,-1.2) K7(1.6,-1.2) K8(2.4,-1.2) K9(3.2,-1.2) L1(-3.2,-2) L2(-2.4,-2) L3(-1.6,-2) L7(1.6,-2) L8(2.4,-2) L9(3.2,-2) M1(-3.2,-2.8) M2(-2.4,-2.8) M3(-1.6,-2.8) M7(1.6,-2.8) M8(2.4,-2.8) M9(3.2,-2.8) N1(-3.2,-3.6) N2(-2.4,-3.6) N3(-1.6,-3.6) N7(1.6,-3.6) N8(2.4,-3.6) N9(3.2,-3.6) P1(-3.2,-4.4) P2(-2.4,-4.4) P3(-1.6,-4.4) P7(1.6,-4.4) P8(2.4,-4.4) P9(3.2,-4.4) R1(-3.2,-5.2) R2(-2.4,-5.2) R3(-1.6,-5.2) R7(1.6,-5.2) R8(2.4,-5.2) R9(3.2,-5.2) T1(-3.2,-6) T2(-2.4,-6) T3(-1.6,-6) T7(1.6,-6) T8(2.4,-6) T9(3.2,-6)
Top Overlay:
  region: -4.8,6.8 -3.5,6.8 -4.8,5.5
  lines w0.3: -4.8,-6.8 4.8,-6.8 4.8,6.8 -4.8,6.8 -4.8,-6.8
Top Assy:
  circle w0.05: c-3.5,5.5 r0.3
  lines w0.05: -4.5,-6.5 -4.5,6.5 4.5,6.5 4.5,-6.5 -4.5,-6.5
  text ".Designator" at -3.443,-0.467 h2
Top Text:
  lines w0.05: -4.75,-6.75 -4.75,6.75 4.75,6.75 4.75,-6.75 -4.75,-6.75
  lines w0.1: -0.5,0 0.5,0 ; 0,-0.5 0,0.5
3D body "TFBGA-96.STEP": height 1.28, standoff -0.03, extent -4.5,-6.5 4.5,6.5

## TO-3PL (VERTICAL,BLACK) [mm]
height 4.57
pads (3):
  rect 4x3 hole 1.8: 1(0,5.45)
  oval 4x3 hole 1.8: 2(0,0) 3(0,-5.45)
Top Overlay:
  circle w0.6: c-3.3,5.5 r0.3
  rectangle: 2.8,-10.5 3.65,10.5
  lines w0.2: -2.2,-10.4 2.8,-10.4 2.8,10.4 -2.2,10.4
Top Assy:
  lines w0.05: 2.6,-9.6 2.601,-9.6 2.601,-7.95 ; 2.6,-7.95 2.601,-7.95 ; 2.6,-6.671 2.601,-6.671 ; 2.6,-6.6 2.601,-6.6 ; 2.6,6.6 2.601,6.6 ; 2.6,6.671 2.601,6.671 ; 2.6,7.95 2.601,7.95 ; 2.6,9.6 2.601,9.6 2.601,7.95 ; 0.6,-10.25 0.6,10.25 ; 0.6,-10.25 2.6,-10.145 2.6,10.145 0.6,10.25 ; 0.6,-10.25 -2.6,-9.97 -2.6,9.97 0.6,10.25 ; 2.601,-7.95 2.601,-6.671 ; 2.601,-6.671 2.601,-6.6 ; 2.601,-6.6 2.601,6.6 ; 2.601,6.6 2.601,6.671 ; 2.601,6.671 2.601,7.95
  text ".Designator" at -4.2,5.162 h3
3D body "TO-3PL_BLACK.STEP": height 35, standoff -3.5, extent -2.6,-10.25 2.601,10.25

## TO-3PL (VERTICAL,GREEN) [mm]
height 4.57
pads (3):
  rect 4x3 hole 1.8: 1(0,5.45)
  oval 4x3 hole 1.8: 2(0,0) 3(0,-5.45)
Top Overlay:
  circle w0.6: c-3.3,5.5 r0.3
  rectangle: 2.8,-10.5 3.65,10.5
  lines w0.2: -2.2,-10.4 2.8,-10.4 2.8,10.4 -2.2,10.4
Top Assy:
  lines w0.05: 2.6,-9.6 2.601,-9.6 2.601,-7.95 ; 2.6,-7.95 2.601,-7.95 ; 2.6,-6.671 2.601,-6.671 ; 2.6,-6.6 2.601,-6.6 ; 2.6,6.6 2.601,6.6 ; 2.6,6.671 2.601,6.671 ; 2.6,7.95 2.601,7.95 ; 2.6,9.6 2.601,9.6 2.601,7.95 ; 0.6,-10.25 -2.6,-9.97 -2.6,9.97 0.6,10.25 ; 0.6,-10.25 2.6,-10.145 2.6,10.145 0.6,10.25 ; 0.6,-10.25 0.6,10.25 ; 2.601,-7.95 2.601,-6.671 ; 2.601,-6.671 2.601,-6.6 ; 2.601,-6.6 2.601,6.6 ; 2.601,6.6 2.601,6.671 ; 2.601,6.671 2.601,7.95
  text ".Designator" at -4.2,5.162 h3
3D body "TO-3PL_GREEN.STEP": height 35, standoff -3.5, extent -2.6,-10.25 2.601,10.25

## TO-3PN (HORIZONTAL, BOTTOM) [mm]
height 4.57
pads (4):
  rect 4x3 hole 1.8: 1(0,5.45)
  oval 4x3 hole 1.8: 2(0,0) 3(0,-5.45)
  round 0 hole 3.4 unplated: M(-22.475,0)
Top Overlay:
  circle w0.6: c3.25,5.5 r0.3
  lines w0.2: -7.2,-6.5 -4.4,-6.5 -4.1,-6 -2.4,-6 -2.4,-4.9 -4.1,-4.9 -4.4,-4.4 -7.2,-4.4 ; -7.2,-1.6 -4.3,-1.6 -4,-0.6 -2.4,-0.6 -2.4,0.6 -4,0.6 -4.3,1.6 -7.2,1.6 ; -7.2,4.4 -4.4,4.4 -4.1,4.9 -2.4,4.9 -2.4,6 -4.1,6 -4.4,6.5 -7.2,6.5 ; -27.8,-6.8 -27.8,6.8 -25.5,8.2 -7.2,8.2 -7.2,-8.2 -25.5,-8.2 -27.8,-6.8
Top Assy:
  circle w0.013: c-22.475,0 r3.5
  circle w0.013: c-22.475,0 r1.6
  lines w0.013: -7.575,-6.45 -4.375,-6.45 -4.075,-5.95 -1.975,-5.95 ; -7.575,-4.45 -4.375,-4.45 -4.075,-4.95 -1.975,-4.95 ; -7.575,-1.5 -4.375,-1.5 -4.075,-0.5 -1.975,-0.5 ; -7.575,1.5 -4.375,1.5 -4.075,0.5 -1.975,0.5 ; -7.575,4.45 -4.375,4.45 -4.075,4.95 -1.975,4.95 ; -7.575,6.45 -4.375,6.45 -4.075,5.95 -1.975,5.95 ; -25.475,-7.899 -20.142,-7.899 ; -25.475,-7.9 -27.475,-6.7 -27.475,6.7 -25.475,7.9 ; -25.475,-7.9 -25.475,-7.899 ; -25.475,7.899 -20.142,7.899 ; -25.475,7.899 -25.475,7.9 ; -20.142,-7.899 ccw(c-20.125,-7.75) -20.125,-7.9 -7.725,-7.9 ; -20.142,-7.899 -20.142,-6.8 -10.715,-6.8 -10.715,6.8 -20.142,6.8 -20.142,7.899 ; -20.142,-7.899 -7.725,-7.899 ; -20.142,7.899 cw(c-20.125,7.75) -20.125,7.9 -7.725,7.9 ; -20.142,7.899 -7.725,7.899 ; -7.725,-7.9 ccw(c-7.725,-7.75) -7.575,-7.75 ; -7.725,-7.899 ccw(c-7.725,-7.749) -7.575,-7.749 ; -7.725,7.9 cw(c-7.725,7.75) -7.575,7.75 ; -7.725,7.899 cw(c-7.725,7.749) -7.575,7.749 ; -7.575,-7.749 -7.575,7.749 ; -1.975,-5.95 0.35,-5.95 0.35,-4.95 -1.975,-4.95 ; -1.975,-5.95 -1.975,-4.95 ; -1.975,-0.5 0.35,-0.5 0.35,0.5 -1.975,0.5 ; -1.975,-0.5 -1.975,0.5 ; -1.975,4.95 0.35,4.95 0.35,5.95 -1.975,5.95 ; -1.975,4.95 -1.975,5.95
  text ".Designator" at -14.5,-5.062 h3
3D body "TO-3PN_HOR_BOT.STEP": height 5, standoff -2.8, extent -27.475,-7.9 0.35,7.9

## TO-3PN (HORIZONTAL, TOP) [mm]
height 4.57
pads (4):
  rect 4x3 hole 1.8: 1(0,-5.45)
  oval 4x3 hole 1.8: 2(0,0) 3(0,5.45)
  round 0 hole 3.4 unplated: M(22.475,0)
Top Overlay:
  circle w0.6: c-3,-5.5 r0.3
  lines w0.2: 7.2,-6.5 4.4,-6.5 4.1,-6 2.4,-6 2.4,-4.9 4.1,-4.9 4.4,-4.4 7.2,-4.4 ; 7.2,-1.6 4.3,-1.6 4,-0.6 2.4,-0.6 2.4,0.6 4,0.6 4.3,1.6 7.2,1.6 ; 7.2,4.4 4.4,4.4 4.1,4.9 2.4,4.9 2.4,6 4.1,6 4.4,6.5 7.2,6.5 ; 7.2,-8.2 7.2,8.2 25.5,8.2 27.8,6.8 27.8,-6.8 25.5,-8.2 7.2,-8.2
Top Assy:
  drawing of 608 lines, arcs and shapes, not listed
  text ".Designator" at 15.2,-5.162 h3
3D body "TO-3PN_HOR_TOP.STEP": height 5.3, standoff -3, extent -0.3,-7.9 27.525,7.9